# Altium footprint library AD_Lib.PcbLib: 508 footprints (part 19 of 32)
Each footprint in its own frame and in the unit in brackets; x right, y up, seen from the top. Pads: shape width x height; smd on the part's side, far side on the other; paste and mask are expansions set on the pad; w line width, h text height; cw(c..) or ccw(c..) is an arc to the next point about the centre after c.
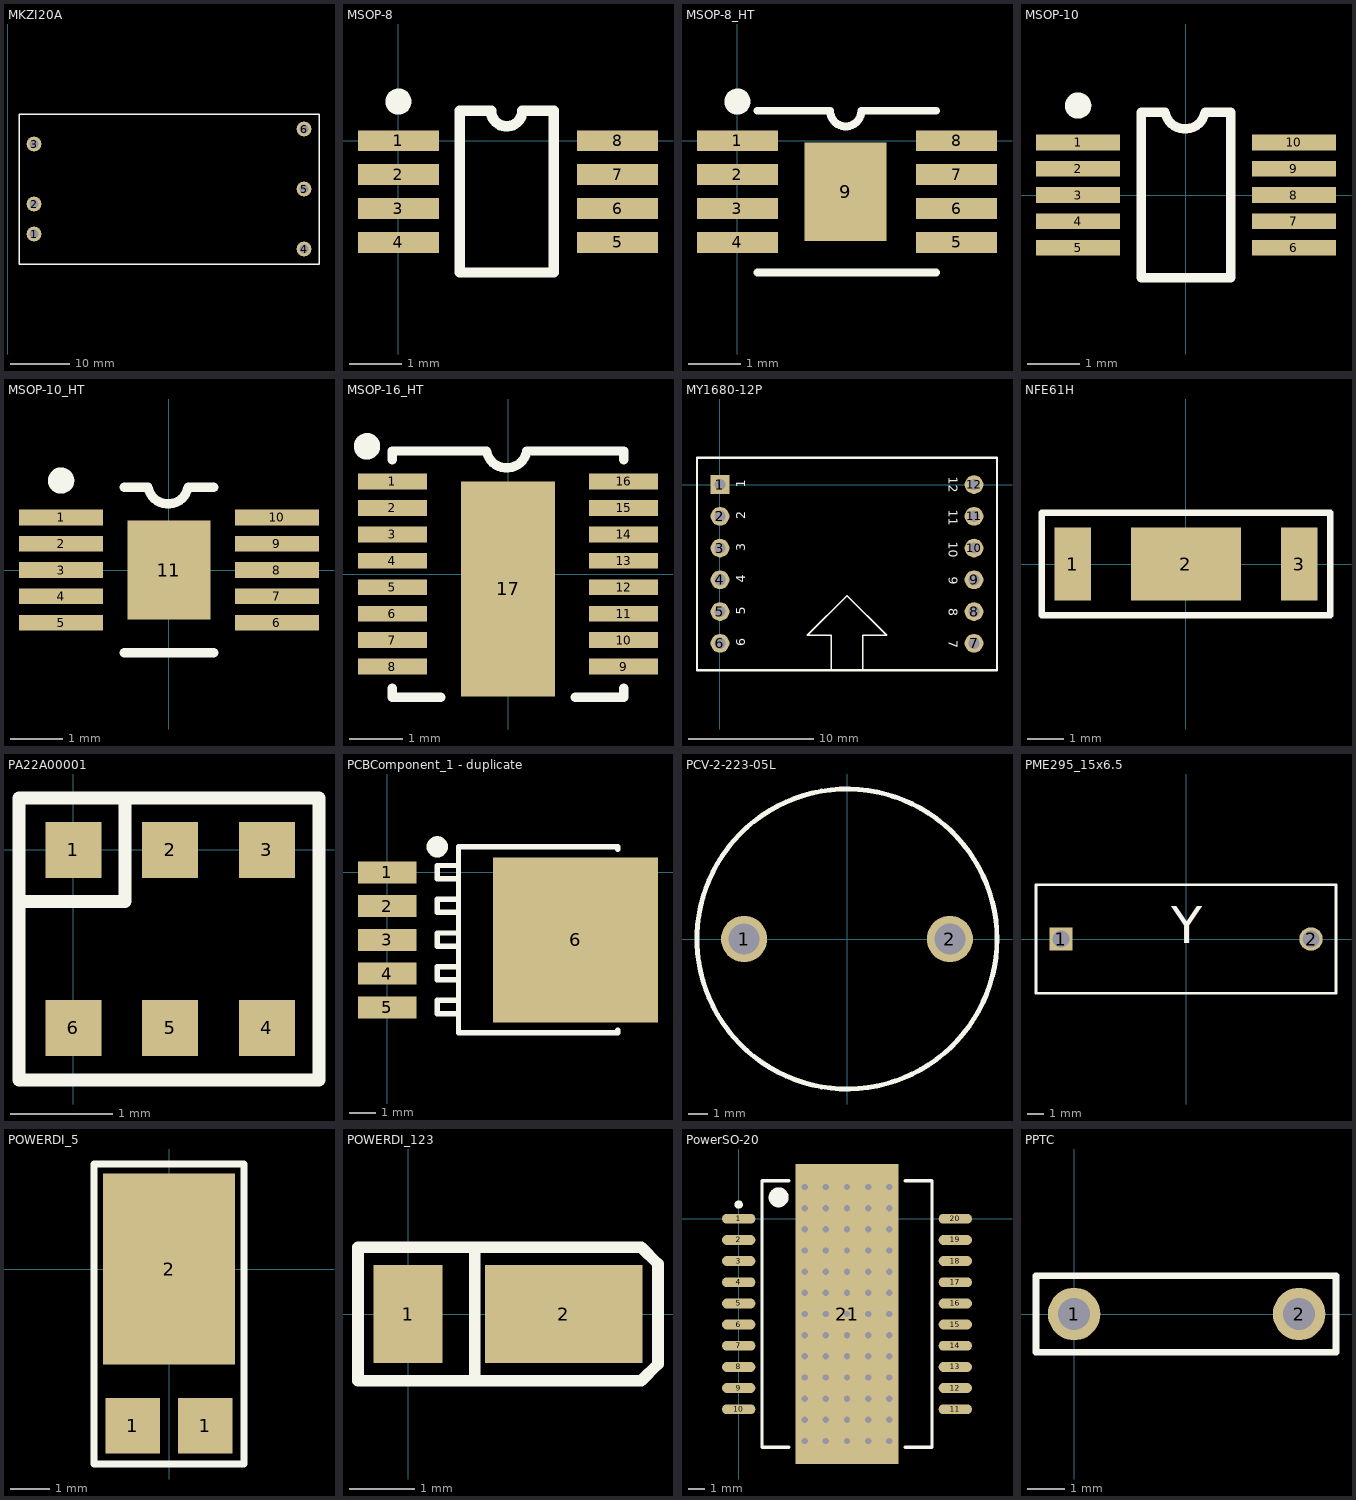
[diagram p18: the footprints below, top view; thin cyan lines are the x and y axes]

## MKZI20A [mm] "MINMAX隔离电源，20W，带\"A\"后缀"
height 11
pads (6):
  round 2.5 hole 1.5: 1(4.445,44.45) 2(4.445,49.53) 3(4.445,59.69) 4(50.165,41.91) 5(50.165,52.07) 6(50.165,62.23)
Top Overlay:
  lines w0.254: 1.905,39.37 52.705,39.37 52.705,64.77 1.905,64.77 1.905,39.37
Bottom Overlay:
  text "Trim" at 47.879,61.468 h2.54
  text "-Vout" at 47.879,51.308 h2.54
  text "+Vout" at 47.879,41.148 h2.54
  text "ON/OFF" at 13.462,58.928 h2.54
  text "-Vin" at 10.16,48.768 h2.54
  text "+Vin" at 10.16,43.688 h2.54

## MSOP-8 [mm] "Shrink Small Outline; 8 Leads; Body Width 3 mm; Pitch 0.65 mm"
height 1.1
pads (8):
  rect 1.55x0.4 smd: 1(0,0) 2(0,-0.65) 3(0,-1.3) 4(0,-1.95) 5(4.2,-1.95) 6(4.2,-1.3) 7(4.2,-0.65) 8(4.2,0)
Top Overlay:
  circle w0.25: c0,0.75 r0.125
  lines w0.2: 1.175,-2.525 2.975,-2.525 2.975,0.575 2.375,0.575 cw(c2.075,0.575) 1.775,0.575 1.175,0.575 1.175,-2.525

## MSOP-8_HT [mm] "Shrink Small Outline; 8 Leads; Body Width 3 mm; Pitch 0.65 mm"
height 1.1
pads (9):
  rect 1.55x0.4 smd: 1(0,0) 2(0,-0.65) 3(0,-1.3) 4(0,-1.95) 5(4.2,-1.95) 6(4.2,-1.3) 7(4.2,-0.65) 8(4.2,0)
  rect 1.57x1.89 smd: 9(2.075,-0.975)
Top Overlay:
  circle w0.25: c0,0.75 r0.125
  lines w0.152: 0.381,-2.525 3.81,-2.525 ; 0.381,0.575 1.775,0.575 ccw(c2.075,0.575) 2.375,0.575 3.81,0.575

## MSOP-10 [mm] "Body Width 3 mm; Pitch 0.5 mm;(uMAX-10&RM-10)"
height 1.1
pads (10):
  rect 1.6x0.3 smd: 1(-2.05,1) 2(-2.05,0.5) 3(-2.05,0) 4(-2.05,-0.5) 5(-2.05,-1) 6(2.05,-1) 7(2.05,-0.5) 8(2.05,0) 9(2.05,0.5) 10(2.05,1)
Top Overlay:
  circle w0.25: c-2.05,1.7 r0.125
  lines w0.178: -0.85,-1.575 -0.85,1.575 -0.399,1.575 ccw(c-0.018,1.642) 0.363,1.575 0.85,1.575 0.85,-1.575 -0.85,-1.575

## MSOP-10_HT [mm] "Body Width 3 mm; Pitch 0.5 mm;(uMAX-10&RM-10)"
height 1.1
pads (11):
  rect 1.6x0.3 smd: 1(-2.05,1) 2(-2.05,0.5) 3(-2.05,0) 4(-2.05,-0.5) 5(-2.05,-1) 6(2.05,-1) 7(2.05,-0.5) 8(2.05,0) 9(2.05,0.5) 10(2.05,1)
  rect 1.575x1.88 smd: 11(0,0)
Top Overlay:
  circle w0.25: c-2.05,1.7 r0.125
  lines w0.178: -0.85,-1.575 0.85,-1.575 ; -0.85,1.575 -0.399,1.575 ccw(c-0.018,1.642) 0.363,1.575 0.85,1.575

## MSOP-16_HT [mm] "SOIC, 14-Leads, Body 8.7x3.9mm, Pitch 1.27mm, IPC Medium Density"
height 1.75
pads (17):
  rect 1.3x0.3 smd: 1(-2.184,1.75) 2(-2.184,1.25) 3(-2.184,0.75) 4(-2.184,0.25) 5(-2.184,-0.25) 6(-2.184,-0.75) 7(-2.184,-1.25) 8(-2.184,-1.75) 9(2.184,-1.75) 10(2.184,-1.25) 11(2.184,-0.75) 12(2.184,-0.25) 13(2.184,0.25) 14(2.184,0.75) 15(2.184,1.25) 16(2.184,1.75)
  rect 1.778x4.064 smd: 17(0,-0.282)
Top Overlay:
  circle w0.25: c-2.665,2.413 r0.125
  lines w0.178: -2.184,-2.159 -2.184,-2.325 -1.27,-2.325 ; -2.184,2.159 -2.184,2.325 -0.406,2.325 ccw(c-0.025,2.392) 0.356,2.325 2.184,2.325 2.184,2.159 ; 1.27,-2.325 2.184,-2.325 2.184,-2.159

## MY1680-12P [mm] "深圳迈优语音模块"
height 1.45
pads (12):
  rect 1.5x1.5 hole 0.9: 1(0,0)
  round 1.5 hole 0.9: 2(0,-2.54) 3(0,-5.08) 4(0,-7.62) 5(0,-10.16) 6(0,-12.7) 7(20.32,-12.7) 8(20.32,-10.16) 9(20.32,-7.62) 10(20.32,-5.08) 11(20.32,-2.54) 12(20.32,0)
Top Overlay:
  lines w0.127: 8.89,-14.859 8.89,-12.065 6.985,-12.065 10.16,-8.89 13.335,-12.065 11.43,-12.065 11.43,-14.85
  lines w0.2: -1.84,-14.85 22.16,-14.85 22.16,2.15 -1.84,2.15 -1.84,-14.85
  text "6" at 2.286,-12.954 h1.27
  text "5" at 2.286,-10.414 h1.27
  text "4" at 2.286,-7.874 h1.27
  text "3" at 2.286,-5.334 h1.27
  text "2" at 2.286,-2.794 h1.27
  text "1" at 2.286,-0.254 h1.27
  text "12" at 18.034,0.635 h1.27
  text "11" at 18.034,-2.032 h1.27
  text "10" at 18.034,-4.572 h1.27
  text "9" at 18.034,-7.366 h1.27
  text "8" at 18.034,-9.906 h1.27
  text "7" at 18.034,-12.446 h1.27
Bottom Overlay:
  text "6" at 2.286,-12.573 h1.27
  text "5" at 2.286,-10.033 h1.27
  text "4" at 2.286,-7.493 h1.27
  text "3" at 2.286,-4.953 h1.27
  text "2" at 2.286,-2.413 h1.27
  text "1" at 2.286,0.127 h1.27
  text "12" at 18.034,-0.381 h1.27
  text "11" at 18.034,-2.921 h1.27
  text "10" at 18.034,-5.461 h1.27
  text "9" at 18.034,-7.747 h1.27
  text "8" at 18.034,-10.287 h1.27
  text "7" at 18.034,-12.827 h1.27

## NFE61H [mm] "EMI滤波器（电容型），Murata"
height 2
pads (3):
  rect 1x2 smd: 1(-3.1,0) 3(3.1,0)
  rect 3x2 smd: 2(0,0)
Top Overlay:
  lines w0.178: -3.937,-1.397 -3.937,1.397 3.937,1.397 3.937,-1.397 -3.937,-1.397

## PA22A00001 [mm] "TXC之光传感器"
height 1
pads (6):
  rect 0.55x0.55 smd: 1(0,0) 2(0.95,0) 3(1.9,0) 4(1.9,-1.75) 5(0.95,-1.75) 6(0,-1.75)
Top Overlay:
  lines w0.127: -0.533,-0.508 0.508,-0.508 0.508,0.508 ; -0.533,-2.261 2.413,-2.261 2.413,0.508 -0.533,0.508 -0.533,-2.261

## PCBComponent_1 - duplicate [mil]
pads (6):
  rect 86.61x32.5 smd: 1(0,0) 2(0,-50) 3(0,-100) 4(0,-150) 5(0,-200)
  rect 244.5x244.5 smd: 6(279,-100)
Top Overlay:
  lines w7.9: 101.6,-209.4 74.1,-209.4 74.1,-189.8 101.6,-189.8 ; 101.6,-159.4 74.1,-159.4 74.1,-139.8 101.6,-139.8 ; 101.6,-109.4 74.1,-109.4 74.1,-89.8 101.6,-89.8 ; 101.6,-59.4 74.1,-59.4 74.1,-39.8 101.6,-39.8 ; 101.6,-9.4 74.1,-9.4 74.1,10.2 101.6,10.2 ; 341.8,-233.9 341.8,-237.8 105.6,-237.8 105.6,37.8 341.8,37.8 341.8,33.9
  lines w15.7: 74.1,45.7 ccw(c74.15,37.8) 74.2,45.7

## PCV-2-223-05L [mm] "Coilcraft之PCV系列直立电感"
pads (2):
  round 2.4 hole 1.6: 1(-5.35,0) 2(5.35,0)
Top Overlay:
  circle w0.254: c0,0 r7.8

## PME295_15x6.5 [mm] "Kemet之PME295系列Y1电容"
height 12.5
pads (2):
  rect 1.4x1.4 hole 1 paste+0 mask+0.076: 1(-7.5,0)
  round 1.4 hole 1 paste+0 mask+0.076: 2(7.5,0)
Top Overlay:
  lines w0.152: -9,-3.25 9,-3.25 9,3.25 -9,3.25 -9,-3.25
  text "Y" at -0.889,-1.016 h3.81

## POWERDI_5 [mm] "DIODE之肖脱基二极管"
height 1
pads (3):
  rect 1.39x1.4 smd: 1(-0.92,-3.982) 1(0.92,-3.982)
  rect 3.36x4.86 smd: 2(0,0)
Top Overlay:
  lines w0.178: -1.905,-4.953 -1.905,2.667 1.905,2.667 1.905,-4.953 -1.905,-4.953

## POWERDI_123 [mm] "DIODE之肖脱基二极管"
height 1
pads (2):
  rect 1.05x1.5 smd: 1(0,0)
  rect 2.4x1.5 smd: 2(2.375,0)
Top Overlay:
  lines w0.178: 1.016,-1.016 1.016,1.016 ; -0.762,-1.016 3.556,-1.016 3.81,-0.762 3.81,0.762 3.556,1.016 -0.762,1.016 -0.762,-1.016

## PowerSO-20 [mm] "20-Pin Small Outline Package 1.27 mm Pitch, IPC High Density"
height 3.6
pads (21):
  oval 2x0.6 smd: 1(0,0) 2(0,-1.27) 3(0,-2.54) 4(0,-3.81) 5(0,-5.08) 6(0,-6.35) 7(0,-7.62) 8(0,-8.89) 9(0,-10.16) 10(0,-11.43) 11(13,-11.43) 12(13,-10.16) 13(13,-8.89) 14(13,-7.62) 15(13,-6.35) 16(13,-5.08) 17(13,-3.81) 18(13,-2.54) 19(13,-1.27) 20(13,0)
  rect 6.2x18 smd: 21(6.5,-5.715)
via 9.04,-9.525 diameter 0.762 hole 0.381
via 7.77,-9.525 diameter 0.762 hole 0.381
via 6.5,-9.525 diameter 0.762 hole 0.381
via 5.23,-9.525 diameter 0.762 hole 0.381
via 3.96,-9.525 diameter 0.762 hole 0.381
via 9.04,-10.795 diameter 0.762 hole 0.381
via 7.77,-10.795 diameter 0.762 hole 0.381
via 6.5,-10.795 diameter 0.762 hole 0.381
via 5.23,-10.795 diameter 0.762 hole 0.381
via 3.96,-10.795 diameter 0.762 hole 0.381
via 3.96,1.905 diameter 0.762 hole 0.381
via 5.23,1.905 diameter 0.762 hole 0.381
via 6.5,1.905 diameter 0.762 hole 0.381
via 7.77,1.905 diameter 0.762 hole 0.381
via 9.04,1.905 diameter 0.762 hole 0.381
via 9.04,0.635 diameter 0.762 hole 0.381
via 7.77,0.635 diameter 0.762 hole 0.381
via 6.5,0.635 diameter 0.762 hole 0.381
via 5.23,0.635 diameter 0.762 hole 0.381
via 3.96,0.635 diameter 0.762 hole 0.381
via 9.04,-0.635 diameter 0.762 hole 0.381
via 7.77,-0.635 diameter 0.762 hole 0.381
via 6.5,-0.635 diameter 0.762 hole 0.381
via 5.23,-0.635 diameter 0.762 hole 0.381
via 3.96,-0.635 diameter 0.762 hole 0.381
via 9.04,-1.905 diameter 0.762 hole 0.381
via 7.77,-1.905 diameter 0.762 hole 0.381
via 6.5,-1.905 diameter 0.762 hole 0.381
via 5.23,-1.905 diameter 0.762 hole 0.381
via 3.96,-1.905 diameter 0.762 hole 0.381
via 9.04,-3.175 diameter 0.762 hole 0.381
via 7.77,-3.175 diameter 0.762 hole 0.381
via 6.5,-3.175 diameter 0.762 hole 0.381
via 5.23,-3.175 diameter 0.762 hole 0.381
via 3.96,-3.175 diameter 0.762 hole 0.381
via 9.04,-4.445 diameter 0.762 hole 0.381
via 7.77,-4.445 diameter 0.762 hole 0.381
via 6.5,-4.445 diameter 0.762 hole 0.381
via 5.23,-4.445 diameter 0.762 hole 0.381
via 3.96,-4.445 diameter 0.762 hole 0.381
via 9.04,-5.715 diameter 0.762 hole 0.381
via 7.77,-5.715 diameter 0.762 hole 0.381
via 6.5,-5.715 diameter 0.762 hole 0.381
via 5.23,-5.715 diameter 0.762 hole 0.381
via 3.96,-5.715 diameter 0.762 hole 0.381
via 9.04,-6.985 diameter 0.762 hole 0.381
via 7.77,-6.985 diameter 0.762 hole 0.381
via 6.5,-6.985 diameter 0.762 hole 0.381
via 5.23,-6.985 diameter 0.762 hole 0.381
via 3.96,-6.985 diameter 0.762 hole 0.381
via 9.04,-8.255 diameter 0.762 hole 0.381
via 7.77,-8.255 diameter 0.762 hole 0.381
via 6.5,-8.255 diameter 0.762 hole 0.381
via 5.23,-8.255 diameter 0.762 hole 0.381
via 3.96,-8.255 diameter 0.762 hole 0.381
via 9.04,-12.065 diameter 0.762 hole 0.381
via 7.77,-12.065 diameter 0.762 hole 0.381
via 6.5,-12.065 diameter 0.762 hole 0.381
via 5.23,-12.065 diameter 0.762 hole 0.381
via 3.96,-12.065 diameter 0.762 hole 0.381
via 9.04,-13.335 diameter 0.762 hole 0.381
via 7.77,-13.335 diameter 0.762 hole 0.381
via 6.5,-13.335 diameter 0.762 hole 0.381
via 5.23,-13.335 diameter 0.762 hole 0.381
via 3.96,-13.335 diameter 0.762 hole 0.381
Top Overlay:
  circle w0.25: c0,0.85 r0.125
  circle w0.6: c2.4,1.285 r0.3
  lines w0.2: 3,-13.715 1.4,-13.715 1.4,2.285 3,2.285 ; 10,-13.715 11.6,-13.715 11.6,2.285 10,2.285
Mechanical 15:
  lines w0.1: 6,-5.715 7,-5.715 ; 6.5,-6.215 6.5,-5.215

## PPTC [mm] "72V/1.1A"
height 18
pads (2):
  round 1.4 hole 0.85: 1(0,0) 2(6,0)
Top Overlay:
  lines w0.178: -1.016,0 -1.016,1.016 6.985,1.016 6.985,-1.016 -1.016,-1.016 -1.016,0.127